# Altium footprint library main.PcbLib: 217 footprints (part 13 of 14)
Each footprint in its own frame and in the unit in brackets; x right, y up, seen from the top. Pads: shape width x height; smd on the part's side, far side on the other; paste and mask are expansions set on the pad; w line width, h text height; cw(c..) or ccw(c..) is an arc to the next point about the centre after c.
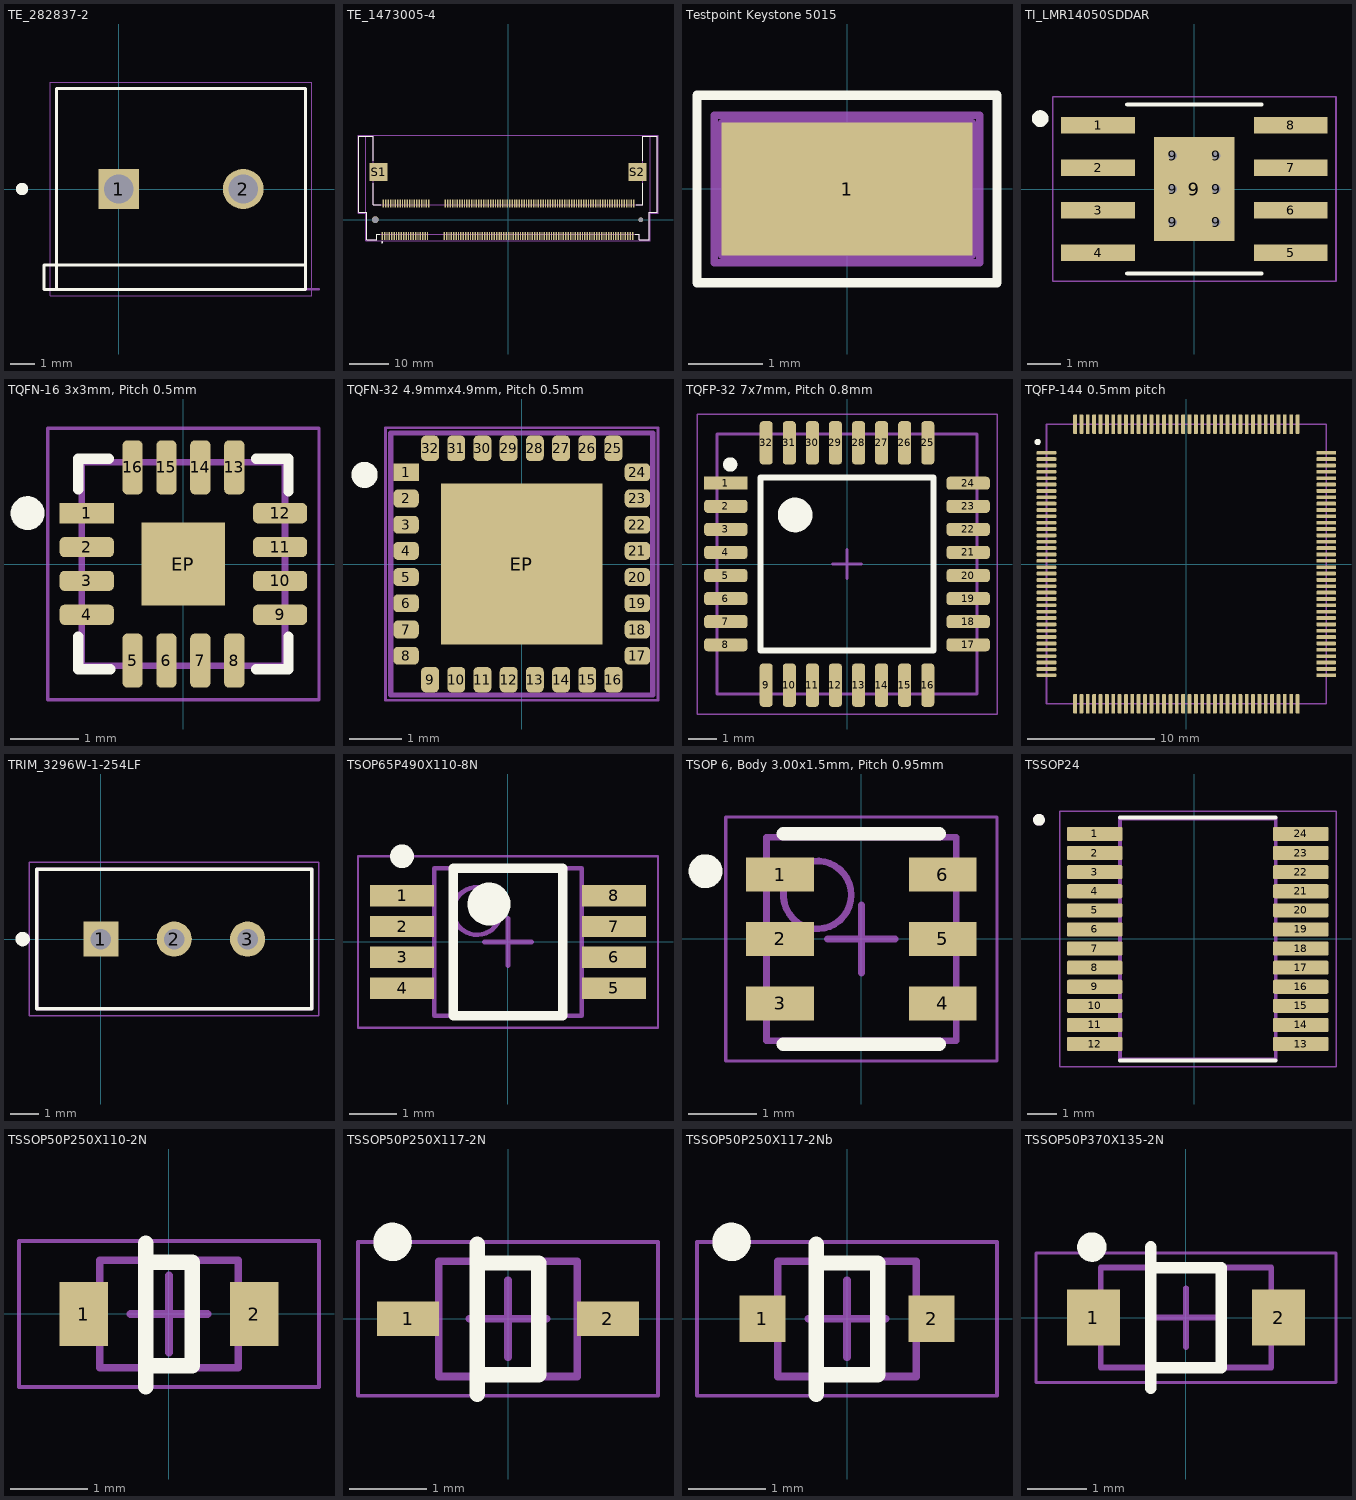
[diagram p12: the footprints below, top view; thin cyan lines are the x and y axes]

## TE_282837-2 [mm]
pads (2):
  rect 1.65x1.65 hole 1.2: 1(0,0)
  round 1.65 hole 1.2: 2(5.08,0)
Top Overlay:
  circle w0.25: c-3.937,0 r0.125
  lines w0.127: -3.048,-4.093 -2.486,-4.093 ; -3.048,-4.073 -3.048,-3.1 ; -3.03,-3.1 -2.522,-3.1 ; -2.54,-3.1 -2.54,-4.1 7.62,-4.1 7.62,-3.1 ; -2.54,-3.1 -2.54,4.1 7.62,4.1 7.62,-3.1 ; -2.54,-3.1 7.62,-3.1
Mechanical 5:
  lines w0.1: -2.833,-4.093 8.167,-4.093
  text "BLOCK ENTRY" at 8.367,-3.643 h1
Mechanical 7:
  text ".Designator" at 0.388,-2.051 h0.76
Mechanical 15:
  lines w0.05: -2.79,-4.35 7.87,-4.35 7.87,4.35 -2.79,4.35 -2.79,-4.35
3D body "c-282837-2-g2-3d.stp": height 9.79, standoff -3.71, extent -3.094,-4.064 7.666,4.136

## TE_1473005-4 [mm]
pads (204):
  rect 0.35x2 smd: 1(-31.65,-4.1) 2(-31.35,4.1) 3(-31.05,-4.1) 4(-30.75,4.1) 5(-30.45,-4.1) 6(-30.15,4.1) 7(-29.85,-4.1) 8(-29.55,4.1) 9(-29.25,-4.1) 10(-28.95,4.1) 11(-28.65,-4.1) 12(-28.35,4.1) 13(-28.05,-4.1) 14(-27.75,4.1) 15(-27.45,-4.1) 16(-27.15,4.1) 17(-26.85,-4.1) 18(-26.55,4.1) 19(-26.25,-4.1) 20(-25.95,4.1) 21(-25.65,-4.1) 22(-25.35,4.1) 23(-25.05,-4.1) 24(-24.75,4.1) 25(-24.45,-4.1) 26(-24.15,4.1) 27(-23.85,-4.1) 28(-23.55,4.1) 29(-23.25,-4.1) 30(-22.95,4.1) 31(-22.65,-4.1) 32(-22.35,4.1) 33(-22.05,-4.1) 34(-21.75,4.1) 35(-21.45,-4.1) 36(-21.15,4.1) 37(-20.85,-4.1) 38(-20.55,4.1) 39(-20.25,-4.1) 40(-19.95,4.1) 41(-16.05,-4.1) 42(-15.75,4.1) 43(-15.45,-4.1) 44(-15.15,4.1) 45(-14.85,-4.1) 46(-14.55,4.1) 47(-14.25,-4.1) 48(-13.95,4.1) 49(-13.65,-4.1) 50(-13.35,4.1) 51(-13.05,-4.1) 52(-12.75,4.1) 53(-12.45,-4.1) 54(-12.15,4.1) 55(-11.85,-4.1) 56(-11.55,4.1) 57(-11.25,-4.1) 58(-10.95,4.1) 59(-10.65,-4.1) 60(-10.35,4.1) 61(-10.05,-4.1) 62(-9.75,4.1) 63(-9.45,-4.1) 64(-9.15,4.1) 65(-8.85,-4.1) 66(-8.55,4.1) 67(-8.25,-4.1) 68(-7.95,4.1) 69(-7.65,-4.1) 70(-7.35,4.1) 71(-7.05,-4.1) 72(-6.75,4.1) 73(-6.45,-4.1) 74(-6.15,4.1) 75(-5.85,-4.1) 76(-5.55,4.1) 77(-5.25,-4.1) 78(-4.95,4.1) 79(-4.65,-4.1) 80(-4.35,4.1) 81(-4.05,-4.1) 82(-3.75,4.1) 83(-3.45,-4.1) 84(-3.15,4.1) 85(-2.85,-4.1) 86(-2.55,4.1) 87(-2.25,-4.1) 88(-1.95,4.1) 89(-1.65,-4.1) 90(-1.35,4.1) 91(-1.05,-4.1) 92(-0.75,4.1) 93(-0.45,-4.1) 94(-0.15,4.1) 95(0.15,-4.1) 96(0.45,4.1) 97(0.75,-4.1) 98(1.05,4.1) 99(1.35,-4.1) 100(1.65,4.1) 101(1.95,-4.1) 102(2.25,4.1) 103(2.55,-4.1) 104(2.85,4.1) 105(3.15,-4.1) 106(3.45,4.1) 107(3.75,-4.1) 108(4.05,4.1) 109(4.35,-4.1) 110(4.65,4.1) 111(4.95,-4.1) 112(5.25,4.1) 113(5.55,-4.1) 114(5.85,4.1) 115(6.15,-4.1) 116(6.45,4.1) 117(6.75,-4.1) 118(7.05,4.1) 119(7.35,-4.1) 120(7.65,4.1) 121(7.95,-4.1) 122(8.25,4.1) 123(8.55,-4.1) 124(8.85,4.1) 125(9.15,-4.1) 126(9.45,4.1) 127(9.75,-4.1) 128(10.05,4.1) 129(10.35,-4.1) 130(10.65,4.1) 131(10.95,-4.1) 132(11.25,4.1) 133(11.55,-4.1) 134(11.85,4.1) 135(12.15,-4.1) 136(12.45,4.1) 137(12.75,-4.1) 138(13.05,4.1) 139(13.35,-4.1) 140(13.65,4.1) 141(13.95,-4.1) 142(14.25,4.1) 143(14.55,-4.1) 144(14.85,4.1) 145(15.15,-4.1) 146(15.45,4.1) 147(15.75,-4.1) 148(16.05,4.1) 149(16.35,-4.1) 150(16.65,4.1) 151(16.95,-4.1) 152(17.25,4.1) 153(17.55,-4.1) 154(17.85,4.1) 155(18.15,-4.1) 156(18.45,4.1) 157(18.75,-4.1) 158(19.05,4.1) 159(19.35,-4.1) 160(19.65,4.1) 161(19.95,-4.1) 162(20.25,4.1) 163(20.55,-4.1) 164(20.85,4.1) 165(21.15,-4.1) 166(21.45,4.1) 167(21.75,-4.1) 168(22.05,4.1) 169(22.35,-4.1) 170(22.65,4.1) 171(22.95,-4.1) 172(23.25,4.1) 173(23.55,-4.1) 174(23.85,4.1) 175(24.15,-4.1) 176(24.45,4.1) 177(24.75,-4.1) 178(25.05,4.1) 179(25.35,-4.1) 180(25.65,4.1) 181(25.95,-4.1) 182(26.25,4.1) 183(26.55,-4.1) 184(26.85,4.1) 185(27.15,-4.1) 186(27.45,4.1) 187(27.75,-4.1) 188(28.05,4.1) 189(28.35,-4.1) 190(28.65,4.1) 191(28.95,-4.1) 192(29.25,4.1) 193(29.55,-4.1) 194(29.85,4.1) 195(30.15,-4.1) 196(30.45,4.1) 197(30.75,-4.1) 198(31.05,4.1) 199(31.35,-4.1) 200(31.65,4.1)
  rect 4.5x4.6 smd: S1(-32.55,12) S2(32.55,12)
  round 1.7 hole 1.7 unplated: ""(-33.4,0)
  round 1.2 hole 1.2 unplated: ""(33.4,0)
Top Overlay:
  circle w0.2: c-31.682,-5.7 r0.1
  lines w0.127: -33.95,9.2 -33.95,3.7 -32,3.7 ; -33.95,14.8 -33.95,21 -37.5,21 -37.5,1.85 -35.55,1.85 -35.55,-5 -33,-5 -33,-3.7 -32.3,-3.7 ; 32,-3.7 33,-3.7 33,-5 35.55,-5 35.55,1.85 37.5,1.85 37.5,21 33.95,21 33.95,14.8 ; 32.3,3.7 33.95,3.7 33.95,9.2
Mechanical 7:
  text ".Designator" at -3.691,8.939 h0.76
Mechanical 13:
  circle w0.2: c-31.682,-5.7 r0.1
  lines w0.127: -35.75,2 -35.75,21 ; 33.96,10 33.95,10 ; 34.02,14 33.95,14 ; 35.75,2 35.75,21 ; 33.95,10 31.65,10 31.65,14 33.95,14 ; 33.95,10 33.95,3.7 -33.95,3.7 -33.95,10 -31.65,10 -31.65,14 -33.95,14 -33.95,21 -37.5,21 -37.5,1.85 -35.55,1.85 -35.55,-5 -33,-5 -33,-3.7 33,-3.7 33,-5 35.55,-5 35.55,1.85 37.5,1.85 37.5,21 33.95,21 33.95,14
Mechanical 15:
  lines w0.05: -37.75,1.6 -35.8,1.6 -35.8,-5.35 35.8,-5.35 35.8,1.6 37.75,1.6 37.75,21.25 -37.75,21.25 -37.75,1.6
3D body "c-1473005-4-j1-3d.stp": height 5.1, standoff -0.8, extent -35.729,-4.959 35.771,21.091

## Testpoint Keystone 5015 [mm] "TEST POINT MINIATURE SMT"
pads (1):
  rect 3.4x1.8 smd: 1(0,0)
Top Overlay:
  lines w0.127: -2.032,-1.27 -2.032,1.27 2.032,1.27 2.032,-1.27 -2.032,-1.27
Mechanical 7:
  text ".Designator" at -0.919,-0.699 h1.52
Mechanical 13:
  lines w0.1: -1.7,-0.9 1.7,-0.9 1.7,0.9 -1.7,0.9 -1.7,-0.9
Mechanical 15:
  lines w0.1: -0.3,0.003 0.3,0.003 ; 0,-0.297 0,0.303 ; -1.8,-1 1.8,-1 1.8,1 -1.8,1 -1.8,-1
3D body "5015KCT-ND_TestPoint.STEP": height 1.5, standoff 0, extent -1.475,-0.492 1.475,0.508

## TI_LMR14050SDDAR [mm]
pads (15):
  rect 2.2x0.5 smd: 1(-2.875,1.905) 2(-2.875,0.635) 3(-2.875,-0.635) 4(-2.875,-1.905) 5(2.875,-1.905) 6(2.875,-0.635) 7(2.875,0.635) 8(2.875,1.905)
  round 0.559 hole 0.254: 9(-0.65,-0.995) 9(-0.65,0) 9(-0.65,0.995) 9(0.65,-0.995) 9(0.65,0) 9(0.65,0.995)
  rect 2.4x3.1 smd: 9(0,0)
Top Overlay:
  circle w0.25: c-4.6,2.1 r0.125
  lines w0.127: -2,-2.519 2,-2.519 ; -2,2.519 2,2.519
Top Paste:
  region: -1.2,1.55 1.2,1.55 1.2,-1.55 -1.2,-1.55
  region: 1.8,2.13 3.95,2.13 3.95,1.68 1.8,1.68
  region: 1.8,0.86 3.95,0.86 3.95,0.41 1.8,0.41
  region: 1.8,-0.41 3.95,-0.41 3.95,-0.86 1.8,-0.86
  region: 1.8,-1.68 3.95,-1.68 3.95,-2.13 1.8,-2.13
  region: -3.95,-1.68 -1.8,-1.68 -1.8,-2.13 -3.95,-2.13
  region: -3.95,-0.41 -1.8,-0.41 -1.8,-0.86 -3.95,-0.86
  region: -3.95,0.86 -1.8,0.86 -1.8,0.41 -3.95,0.41
  region: -3.95,2.13 -1.8,2.13 -1.8,1.68 -3.95,1.68
Top Solder:
  region: 1.705,-0.315 4.045,-0.315 4.045,-0.955 1.705,-0.955
  region: 1.705,0.955 4.045,0.955 4.045,0.315 1.705,0.315
  region: -4.045,-0.315 -1.705,-0.315 -1.705,-0.955 -4.045,-0.955
  region: -4.045,0.955 -1.705,0.955 -1.705,0.315 -4.045,0.315
  region: -4.045,-1.585 -1.705,-1.585 -1.705,-2.225 -4.045,-2.225
  region: -4.045,2.225 -1.705,2.225 -1.705,1.585 -4.045,1.585
  region: 1.705,-1.585 4.045,-1.585 4.045,-2.225 1.705,-2.225
  region: 1.705,2.225 4.045,2.225 4.045,1.585 1.705,1.585
  region: -1.2,1.55 1.2,1.55 1.2,-1.55 -1.2,-1.55
Mechanical 7:
  text ".Designator" at -3.332,-0.953 h1.52
Mechanical 15:
  lines w0.05: -4.225,-2.75 -4.225,2.75 4.225,2.75 4.225,-2.75 -4.225,-2.75
3D body "DDA0008E.stp": height 1.57, standoff 0, extent -3.048,-2.36 2.952,2.54

## TQFN-16 3x3mm, Pitch 0.5mm [mm] "TQFN-16 3x3mm, Pitch 0.5mm"
height 1
pads (17):
  rect 0.8x0.3 smd mask+0.05: 1(-1.425,0.75)
  rrect50% 0.8x0.3 smd mask+0.05: 2(-1.425,0.25) 3(-1.425,-0.25) 4(-1.425,-0.75) 9(1.425,-0.75) 10(1.425,-0.25) 11(1.425,0.25) 12(1.425,0.75)
  rrect50% 0.3x0.8 smd mask+0.05: 5(-0.75,-1.425) 6(-0.25,-1.425) 7(0.25,-1.425) 8(0.75,-1.425) 13(0.75,1.425) 14(0.25,1.425) 15(-0.25,1.425) 16(-0.75,1.425)
  rect 1.23x1.23 smd mask+0.05: EP(0,0)
Top Overlay:
  circle w0.25: c-2.3,0.75 r0.125
  lines w0.152: -1.55,-1.075 -1.55,-1.55 -1.075,-1.55 ; -1.55,1.1 -1.55,1.55 -1.1,1.55 ; 1.075,-1.55 1.55,-1.55 1.55,-1.075 ; 1.075,1.55 1.55,1.55 1.55,1.075
Mechanical 7:
  text ".Designator" at -2.166,-1.342 h0.76
Mechanical 13:
  lines w0.1: -1.5,-1.5 1.5,-1.5 1.5,1.5 -1.5,1.5 -1.5,-1.5
Mechanical 15:
  lines w0.05: -2,-2 2,-2 2,2 -2,2 -2,-2
  lines w0.1: -0.5,0 0.5,0 ; 0,-0.5 0,0.5
3D body: height 1, standoff 0, extent -1.5,-1.5 1.5,1.5

## TQFN-32 4.9mmx4.9mm, Pitch 0.5mm [mm] "TQFN-32 4.9mmx4.9mm, Pitch 0.5mm"
height 1
pads (33):
  rect 0.485x0.34 smd mask+0.05: 1(-2.207,1.75)
  rrect50% 0.485x0.34 smd mask+0.05: 2(-2.207,1.25) 3(-2.207,0.75) 4(-2.207,0.25) 5(-2.207,-0.25) 6(-2.207,-0.75) 7(-2.207,-1.25) 8(-2.207,-1.75) 17(2.207,-1.75) 18(2.207,-1.25) 19(2.207,-0.75) 20(2.207,-0.25) 21(2.207,0.25) 22(2.207,0.75) 23(2.207,1.25) 24(2.207,1.75)
  rrect50% 0.34x0.485 smd mask+0.05: 9(-1.75,-2.207) 10(-1.25,-2.207) 11(-0.75,-2.207) 12(-0.25,-2.207) 13(0.25,-2.207) 14(0.75,-2.207) 15(1.25,-2.207) 16(1.75,-2.207) 25(1.75,2.207) 26(1.25,2.207) 27(0.75,2.207) 28(0.25,2.207) 29(-0.25,2.207) 30(-0.75,2.207) 31(-1.25,2.207) 32(-1.75,2.207)
  rect 3.08x3.08 smd mask+0.05: EP(0,0)
Top Overlay:
  circle w0.25: c-3,1.7 r0.125
Mechanical 7:
  text ".Designator" at -2.2,-3.7 h0.76
Mechanical 13:
  lines w0.1: -2.5,-2.5 -2.5,-0.85 -2.5,0.65 -2.5,2.5 -0.5,2.5 2.5,2.5 2.5,-2.5 -0.5,-2.5 -2.4,-2.5 -2.5,-2.5
Mechanical 15:
  lines w0.05: -2.6,-2.6 2.6,-2.6 2.6,2.6 -2.6,2.6 -2.6,-2.6
  lines w0.1: -0.5,0 0.5,0 ; 0,-0.5 0,0.5
3D body: height 1, standoff 0, extent -2.5,-2.5 2.5,2.5

## TQFP-32 7x7mm, Pitch 0.8mm [mm] "TQFP-32 7x7mm, Pitch 0.8mm"
height 1.6
pads (32):
  rect 1.5x0.45 smd: 1(-4.2,2.8)
  rrect50% 1.5x0.45 smd: 2(-4.2,2) 3(-4.2,1.2) 4(-4.2,0.4) 5(-4.2,-0.4) 6(-4.2,-1.2) 7(-4.2,-2) 8(-4.2,-2.8) 17(4.2,-2.8) 18(4.2,-2) 19(4.2,-1.2) 20(4.2,-0.4) 21(4.2,0.4) 22(4.2,1.2) 23(4.2,2) 24(4.2,2.8)
  rrect50% 0.45x1.5 smd: 9(-2.8,-4.2) 10(-2,-4.2) 11(-1.2,-4.2) 12(-0.4,-4.2) 13(0.4,-4.2) 14(1.2,-4.2) 15(2,-4.2) 16(2.8,-4.2) 25(2.8,4.2) 26(2,4.2) 27(1.2,4.2) 28(0.4,4.2) 29(-0.4,4.2) 30(-1.2,4.2) 31(-2,4.2) 32(-2.8,4.2)
Top Overlay:
  circle w0.25: c-4.05,3.45 r0.125
  circle w0.6: c-1.8,1.7 r0.3
  lines w0.2: -3,-3 -3,3 3,3 3,-3 -3,-3
Mechanical 7:
  text ".Designator" at -2.166,-1.342 h0.76
Mechanical 13:
  circle w0.1: c-1.8,1.7 r0.5
  lines w0.1: -4.5,-4.5 -4.5,4.5 4.5,4.5 4.5,-4.5 -4.5,-4.5
Mechanical 15:
  lines w0.05: -5.2,-5.2 -5.2,5.2 5.2,5.2 5.2,-5.2 -5.2,-5.2
  lines w0.1: -0.5,0 0.5,0 ; 0,-0.5 0,0.5
3D body "User Library-TQFP32-1.STEP": height 1.1, standoff 0, extent -4.509,-4.509 4.509,4.509

## TQFP-144 0.5mm pitch [mm] "TQFP-144 0.5mm pitch"
height 1.85
pads (144):
  rrect50% 1.55x0.3 smd: 1(-11,8.75) 2(-11,8.25) 3(-11,7.75) 4(-11,7.25) 5(-11,6.75) 6(-11,6.25) 7(-11,5.75) 8(-11,5.25) 9(-11,4.75) 10(-11,4.25) 11(-11,3.75) 12(-11,3.25) 13(-11,2.75) 14(-11,2.25) 15(-11,1.75) 16(-11,1.25) 17(-11,0.75) 18(-11,0.25) 19(-11,-0.25) 20(-11,-0.75) 21(-11,-1.25) 22(-11,-1.75) 23(-11,-2.25) 24(-11,-2.75) 25(-11,-3.25) 26(-11,-3.75) 27(-11,-4.25) 28(-11,-4.75) 29(-11,-5.25) 30(-11,-5.75) 31(-11,-6.25) 32(-11,-6.75) 33(-11,-7.25) 34(-11,-7.75) 35(-11,-8.25) 36(-11,-8.75) 73(11,-8.75) 74(11,-8.25) 75(11,-7.75) 76(11,-7.25) 77(11,-6.75) 78(11,-6.25) 79(11,-5.75) 80(11,-5.25) 81(11,-4.75) 82(11,-4.25) 83(11,-3.75) 84(11,-3.25) 85(11,-2.75) 86(11,-2.25) 87(11,-1.75) 88(11,-1.25) 89(11,-0.75) 90(11,-0.25) 91(11,0.25) 92(11,0.75) 93(11,1.25) 94(11,1.75) 95(11,2.25) 96(11,2.75) 97(11,3.25) 98(11,3.75) 99(11,4.25) 100(11,4.75) 101(11,5.25) 102(11,5.75) 103(11,6.25) 104(11,6.75) 105(11,7.25) 106(11,7.75) 107(11,8.25) 108(11,8.75)
  rrect50% 0.3x1.55 smd: 37(-8.75,-11) 38(-8.25,-11) 39(-7.75,-11) 40(-7.25,-11) 41(-6.75,-11) 42(-6.25,-11) 43(-5.75,-11) 44(-5.25,-11) 45(-4.75,-11) 46(-4.25,-11) 47(-3.75,-11) 48(-3.25,-11) 49(-2.75,-11) 50(-2.25,-11) 51(-1.75,-11) 52(-1.25,-11) 53(-0.75,-11) 54(-0.25,-11) 55(0.25,-11) 56(0.75,-11) 57(1.25,-11) 58(1.75,-11) 59(2.25,-11) 60(2.75,-11) 61(3.25,-11) 62(3.75,-11) 63(4.25,-11) 64(4.75,-11) 65(5.25,-11) 66(5.75,-11) 67(6.25,-11) 68(6.75,-11) 69(7.25,-11) 70(7.75,-11) 71(8.25,-11) 72(8.75,-11) 109(8.75,11) 110(8.25,11) 111(7.75,11) 112(7.25,11) 113(6.75,11) 114(6.25,11) 115(5.75,11) 116(5.25,11) 117(4.75,11) 118(4.25,11) 119(3.75,11) 120(3.25,11) 121(2.75,11) 122(2.25,11) 123(1.75,11) 124(1.25,11) 125(0.75,11) 126(0.25,11) 127(-0.25,11) 128(-0.75,11) 129(-1.25,11) 130(-1.75,11) 131(-2.25,11) 132(-2.75,11) 133(-3.25,11) 134(-3.75,11) 135(-4.25,11) 136(-4.75,11) 137(-5.25,11) 138(-5.75,11) 139(-6.25,11) 140(-6.75,11) 141(-7.25,11) 142(-7.75,11) 143(-8.25,11) 144(-8.75,11)
Top Overlay:
  circle w0.25: c-11.7,9.6 r0.125
Mechanical 7:
  text ".Designator" at -2.848,-0.671 h1.52
Mechanical 13:
  circle w0.2: c-11.7,9.6 r0.1
  lines w0.127: -11,-11 11,-11 11,11 -11,11 -11,-11
Mechanical 15:
  lines w0.05: -11,-11 11,-11 11,11 -11,11 -11,-11
3D body "User Library-LQFP144-1.STEP": height 1.63, standoff 0.03, extent -11,-11 11,11

## TRIM_3296W-1-254LF [mm]
pads (3):
  rect 1.218x1.218 hole 0.71: 1(0,0)
  round 1.218 hole 0.71: 2(2.54,0) 3(5.08,0)
Top Overlay:
  circle w0.25: c-2.71,0 r0.125
  lines w0.127: -2.225,-2.41 -2.225,2.42 7.305,2.42 7.305,-2.41 -2.225,-2.41
Mechanical 7:
  text ".Designator" at -1.3,-0.572 h1.52
Mechanical 13:
  lines w0.127: -2.225,-2.41 7.305,-2.41 7.305,2.42 -2.225,2.42 -2.225,-2.41
Mechanical 15:
  lines w0.05: -2.475,-2.66 7.555,-2.66 7.555,2.665 -2.475,2.665 -2.475,-2.66
3D body "User Library-bourns 3296 pot.STEP": height 11.55, standoff -6.4, extent -2.225,-2.418 7.305,2.413

## TSOP65P490X110-8N [mm] "TSOP, 8-Leads, Body 3.00x3.00mm, Pitch 0.65mm, IPC Medium Density"
height 1.1
pads (8):
  rect 1.35x0.45 smd: 1(-2.225,0.975) 2(-2.225,0.325) 3(-2.225,-0.325) 4(-2.225,-0.975) 5(2.225,-0.975) 6(2.225,-0.325) 7(2.225,0.325) 8(2.225,0.975)
Top Overlay:
  circle w0.25: c-2.225,1.8 r0.125
  circle w0.6: c-0.4,0.796 r0.15
  lines w0.2: -1.15,-1.55 -1.15,1.55 1.15,1.55 1.15,-1.55 -1.15,-1.55
Mechanical 7:
  text ".Designator" at -2.57,-0.572 h1.52
Mechanical 13:
  circle w0.1: c-0.65,0.65 r0.5
  lines w0.1: -1.55,-1.55 -1.55,1.55 1.55,1.55 1.55,-1.55 -1.55,-1.55
Mechanical 15:
  lines w0.05: -3.15,-1.8 -3.15,1.8 3.15,1.8 3.15,-1.8 -3.15,-1.8
  lines w0.1: -0.5,0 0.5,0 ; 0,-0.5 0,0.5
3D body "User Library-TSSOP8-1.STEP": height 1.1, standoff 0, extent -2.05,-1.55 2.05,1.55

## TSOP 6, Body 3.00x1.5mm, Pitch 0.95mm [mm] "TSOP 6, Body 3.00x1.5mm, Pitch 0.95mm"
height 1.1
pads (6):
  rect 1x0.5 smd: 1(-1.2,0.95) 2(-1.2,0) 3(-1.2,-0.95) 4(1.2,-0.95) 5(1.2,0) 6(1.2,0.95)
Top Overlay:
  circle w0.25: c-2.3,1 r0.125
  lines w0.2: -1.15,-1.55 1.15,-1.55 ; -1.15,1.55 1.15,1.55
Mechanical 7:
  text ".Designator" at -2.57,-0.572 h1.52
Mechanical 13:
  circle w0.1: c-0.65,0.65 r0.5
  lines w0.1: -1.4,-1.5 1.4,-1.5 1.4,1.5 -1.4,1.5 -1.4,-1.5
Mechanical 15:
  lines w0.05: -2,-1.8 2,-1.8 2,1.8 -2,1.8 -2,-1.8
  lines w0.1: -0.5,0 0.5,0 ; 0,-0.5 0,0.5
3D body "SOT457.step": height 1.02, standoff 0.01, extent -1.35,-1.475 1.4,1.475

## TSSOP24 [mm] "24 leads;  body width 4.4 mm"
pads (24):
  rrect25% 1.9x0.48 smd: 1(-3.382,3.559) 2(-3.382,2.909) 3(-3.382,2.259) 4(-3.382,1.609) 5(-3.382,0.959) 6(-3.382,0.309) 7(-3.382,-0.341) 8(-3.382,-0.991) 9(-3.382,-1.641) 10(-3.382,-2.291) 11(-3.382,-2.941) 12(-3.382,-3.591) 13(3.628,-3.591) 14(3.628,-2.941) 15(3.628,-2.291) 16(3.628,-1.641) 17(3.628,-0.991) 18(3.628,-0.341) 19(3.628,0.309) 20(3.628,0.959) 21(3.628,1.609) 22(3.628,2.259) 23(3.628,2.909) 24(3.628,3.559)
Top Overlay:
  circle w0.2: c-5.282,4.039 r0.1
  lines w0.127: -2.527,-4.151 2.773,-4.151 ; -2.527,4.119 2.773,4.119
Mechanical 7:
  text ".Designator" at -7.65,-0.975 h1.52
Mechanical 13:
  circle w0.2: c-5.282,4.039 r0.1
  lines w0.127: -2.527,-4.116 2.773,-4.116 2.773,4.084 -2.527,4.084 -2.527,-4.116
Mechanical 15:
  lines w0.05: -4.582,-4.366 4.828,-4.366 4.828,4.334 -4.582,4.334 -4.582,-4.366
3D body "TSSOP24_SOT355-1_NEX.step": height 1.09, standoff 0, extent -3.302,-3.95 3.302,3.95

## TSSOP50P250X110-2N [mm] "SOD323 TSSOP, 2-Leads, Body 1.25x1.70mm, Pitch 0.50mm, IPC Medium Density"
height 1.1
pads (2):
  rect 0.63x0.83 smd: 1(-1.11,0) 2(1.11,0)
Top Overlay:
  lines w0.2: -0.3,-0.945 -0.3,0.92 ; -0.3,-0.675 0.3,-0.675 0.3,0.675 -0.3,0.675 -0.3,-0.675
Mechanical 7:
  text ".Designator" at -1.62,-0.67 h1
Mechanical 13:
  lines w0.1: -0.9,-0.7 0.9,-0.7 0.9,0.7 -0.9,0.7 -0.9,-0.7
Mechanical 15:
  lines w0.05: -1.95,-0.95 1.95,-0.95 1.95,0.95 -1.95,0.95 -1.95,-0.95
  lines w0.1: -0.5,0 0.5,0 ; 0,-0.5 0,0.5
3D body "TSSOP50P250X110-2N.step": height 1.1, standoff 0, extent -1.36,-0.7 1.36,0.7

## TSSOP50P250X117-2N [mm] "TSSOP, 2-Leads, Body 1.28x1.66mm, Pitch 0.50mm, IPC Medium Density"
height 1.17
pads (2):
  rect 0.8x0.45 smd: 1(-1.3,0) 2(1.3,0)
Top Overlay:
  circle w0.25: c-1.5,1 r0.125
  lines w0.2: -0.4,-0.98 -0.4,0.97 ; -0.4,-0.725 -0.4,0.725 0.4,0.725 0.4,-0.725 -0.4,-0.725
Mechanical 7:
  text ".Designator" at -1.73,-0.76 h1
Mechanical 13:
  lines w0.1: -0.9,-0.75 -0.9,0.75 0.9,0.75 0.9,-0.75 -0.9,-0.75
Mechanical 15:
  lines w0.05: -1.95,-1 1.95,-1 ; -1.95,-1 -1.95,1 ; -1.95,-1 -1.95,1 ; -1.95,-1 1.95,-1 ; -1.95,1 1.95,1 ; -1.95,1 1.95,1 ; 1.95,-1 1.95,1 ; 1.95,-1 1.95,1
  lines w0.1: -0.5,0 0.5,0 -0.5,0 ; 0,-0.5 0,0.5 0,-0.5
3D body "TSSOP50P250X117-2N.step": height 1.17, standoff 0, extent -1.249,-0.75 1.249,0.75

## TSSOP50P250X117-2Nb [mm] "BAT165AX - TSSOP, 2-Leads, Body 1.28x1.66mm, Pitch 0.50mm, IPC Medium Density"
height 1.17
pads (2):
  rect 0.6x0.6 smd: 1(-1.1,0) 2(1.1,0)
Top Overlay:
  circle w0.25: c-1.5,1 r0.125
  lines w0.2: -0.4,-0.98 -0.4,0.97 ; -0.4,-0.725 -0.4,0.725 0.4,0.725 0.4,-0.725 -0.4,-0.725
Mechanical 7:
  text ".Designator" at -1.73,-0.76 h1
Mechanical 13:
  lines w0.1: -0.9,-0.75 0.9,-0.75 0.9,0.75 -0.9,0.75 -0.9,-0.75
Mechanical 15:
  lines w0.05: -1.95,-1 1.95,-1 ; -1.95,-1 -1.95,1 ; -1.95,-1 -1.95,1 ; -1.95,-1 1.95,-1 ; -1.95,1 1.95,1 ; -1.95,1 1.95,1 ; 1.95,-1 1.95,1 ; 1.95,-1 1.95,1
  lines w0.1: -0.5,0 0.5,0 -0.5,0 ; 0,-0.5 0,0.5 0,-0.5
3D body "TSSOP50P250X117-2N.step": height 1.17, standoff 0, extent -1.249,-0.75 1.249,0.75

## TSSOP50P370X135-2N [mm] "TSSOP, 2-Leads, Body 1.55x2.70mm, Pitch 0.50mm, IPC Medium Density"
height 1.35
pads (2):
  rect 0.9x0.95 smd: 1(-1.575,0) 2(1.575,0)
Top Overlay:
  circle w0.25: c-1.6,1.2 r0.125
  lines w0.2: -0.6,-1.2 -0.6,1.2 ; -0.6,-0.85 -0.6,0.85 0.6,0.85 0.6,-0.85 -0.6,-0.85
Mechanical 7:
  text ".Designator" at -1.651,-0.762 h0.76
Mechanical 13:
  lines w0.1: -1.45,-0.85 -1.45,0.85 1.45,0.85 1.45,-0.85 -1.45,-0.85
Mechanical 15:
  lines w0.05: -2.55,-1.1 -2.55,1.1 ; -2.55,-1.1 2.55,-1.1 ; -2.55,-1.1 2.55,-1.1 ; -2.55,-1.1 -2.55,1.1 ; -2.55,1.1 2.55,1.1 ; -2.55,1.1 2.55,1.1 ; 2.55,-1.1 2.55,1.1 ; 2.55,-1.1 2.55,1.1
  lines w0.1: -0.5,0 0.5,0 -0.5,0 ; 0,-0.5 0,0.5 0,-0.5
3D body "TSSOP50P370X135-2N.step": height 1.35, standoff 0, extent -1.849,-0.85 1.849,0.85